# Altium footprint library Pcb-hionyPcbLib.PcbLib: 580 footprints (part 8 of 37)
Each footprint in its own frame and in the unit in brackets; x right, y up, seen from the top. Pads: shape width x height; smd on the part's side, far side on the other; paste and mask are expansions set on the pad; w line width, h text height; cw(c..) or ccw(c..) is an arc to the next point about the centre after c.
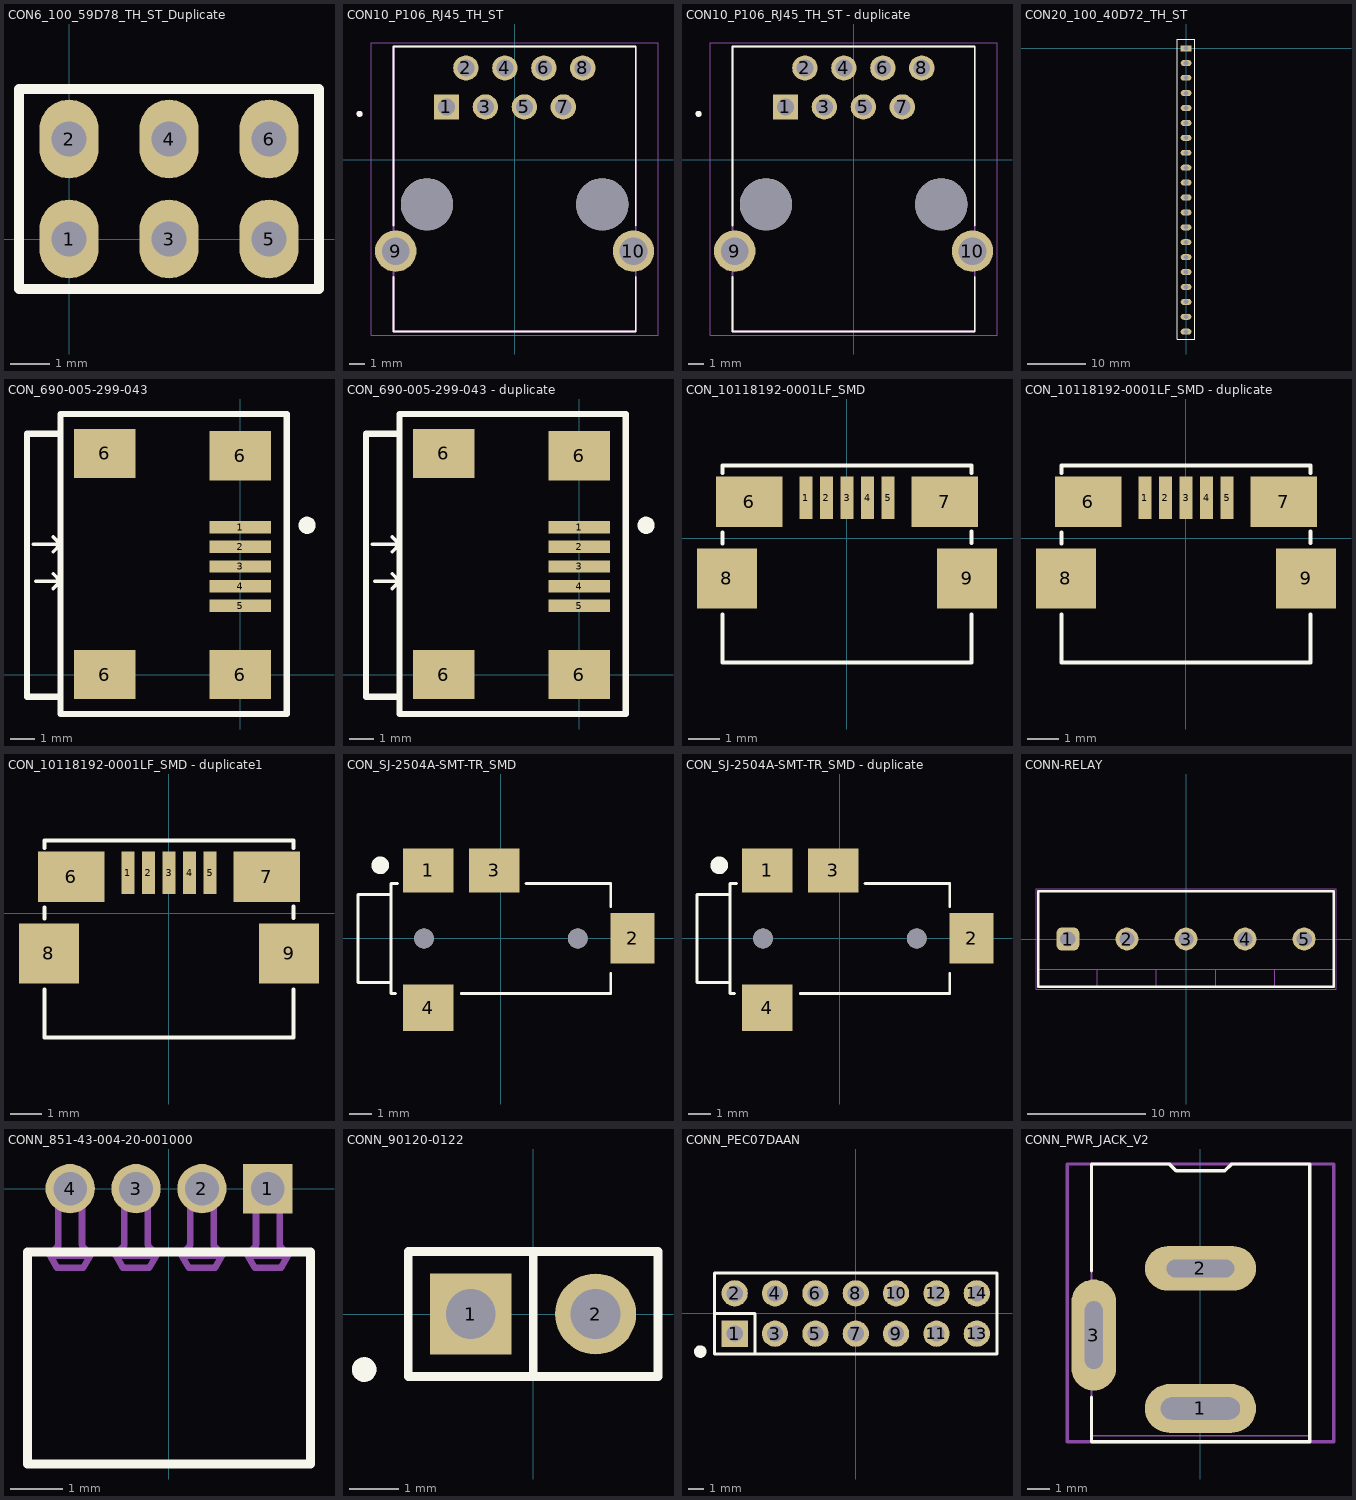
[diagram p7: the footprints below, top view; thin cyan lines are the x and y axes]

## CON6_100_59D78_TH_ST_Duplicate [mm] "Berg strip"
height 10
pads (6):
  oval 1.5x2 hole 0.9: 1(0,0) 2(0,2.54) 3(2.54,0) 4(2.54,2.54) 5(5.08,0) 6(5.08,2.54)
Top Overlay:
  lines w0.254: -1.27,-1.27 6.35,-1.27 6.35,3.81 -1.27,3.81 -1.27,-1.27
3D body "77313-118-06lf.stp": height 8.18, standoff -3.32, extent -1.07,-1.27 6.15,3.56

## CON10_P106_RJ45_TH_ST [mm]
pads (12):
  rect 1.65x1.65 hole 1.1: 1(-4.445,3.43)
  round 1.65 hole 1.1: 2(-3.175,5.97) 3(-1.905,3.43) 4(-0.635,5.97) 5(0.635,3.43) 6(1.905,5.97) 7(3.175,3.43) 8(4.445,5.97)
  round 2.7 hole 1.8: 9(-7.75,-5.97) 10(7.75,-5.97)
  round 3.4 hole 3.4 unplated: ""(-5.715,-2.92) ""(5.715,-2.92)
Top Overlay:
  circle w0.2: c-10.11,2.98 r0.1
  lines w0.127: -7.9,-7.64 -7.9,-11.22 7.9,-11.22 7.9,-7.64 ; -7.9,-4.3 -7.9,7.38 7.9,7.38 7.9,-4.3
Mechanical 13:
  circle w0.2: c-10.11,2.98 r0.1
  lines w0.127: -7.9,-11.22 7.9,-11.22 7.9,7.38 -7.9,7.38 -7.9,-11.22
Mechanical 15:
  lines w0.05: -9.35,-11.47 -9.35,7.63 9.35,7.63 9.35,-11.47 -9.35,-11.47
3D body "A-2004-2-4-LPS-N-R--3DModel-STEP-56544.STEP": height 13.01, standoff -3.79, extent -7.926,-11.205 7.874,7.395

## CON10_P106_RJ45_TH_ST - duplicate [mm]
pads (12):
  rect 1.65x1.65 hole 1.1: 1(-4.445,3.43)
  round 1.65 hole 1.1: 2(-3.175,5.97) 3(-1.905,3.43) 4(-0.635,5.97) 5(0.635,3.43) 6(1.905,5.97) 7(3.175,3.43) 8(4.445,5.97)
  round 2.7 hole 1.8: 9(-7.75,-5.97) 10(7.75,-5.97)
  round 3.4 hole 3.4 unplated: ""(-5.715,-2.92) ""(5.715,-2.92)
Top Overlay:
  circle w0.2: c-10.11,2.98 r0.1
  lines w0.127: -7.9,-7.64 -7.9,-11.22 7.9,-11.22 7.9,-7.64 ; -7.9,-4.3 -7.9,7.38 7.9,7.38 7.9,-4.3
Mechanical 13:
  circle w0.2: c-10.11,2.98 r0.1
  lines w0.127: -7.9,-11.22 7.9,-11.22 7.9,7.38 -7.9,7.38 -7.9,-11.22
Mechanical 15:
  lines w0.05: -9.35,-11.47 -9.35,7.63 9.35,7.63 9.35,-11.47 -9.35,-11.47
3D body "A-2004-2-4-LPS-N-R--3DModel-STEP-56544.STEP": height 13.01, standoff -3.79, extent -7.926,-11.205 7.874,7.395

## CON20_100_40D72_TH_ST [mil] "Berg strip"
height 393.7
pads (20):
  rect 72x40 hole 31.5: 1(0,0)
  oval 72x40 hole 31.5: 2(0,-98.43) 3(0,-196.85) 4(0,-300) 5(0,-400) 6(0,-500) 7(0,-600) 8(0,-700) 9(0,-800) 10(0,-900) 11(0,-1000) 12(0,-1100) 13(0,-1200) 14(0,-1300) 15(0,-1400) 16(0,-1500) 17(0,-1600) 18(0,-1700) 19(0,-1800) 20(0,-1900)
Top Overlay:
  lines w7.87: -58,-1949 57,-1949 57,62.99 -58,62.99 -58,-1949
3D body "pin_header_aw_109_20-t.stp": height 322.83, standoff -118.11, extent -51.14,-1949 47.14,51

## CON_690-005-299-043 [mm]
pads (9):
  rect 2.5x0.5 smd: 1(0,6) 2(0,5.2) 3(0,4.4) 4(0,3.6) 5(0,2.8)
  rect 2.5x2 smd: 6(-5.5,0) 6(-5.5,9) 6(0,0) 6(0,8.9)
Top Overlay:
  circle w0.381: c2.725,6.075 r0.158
  lines w0.152: -8.4,5.3 -7.4,5.3 ; -8.3,3.8 -7.4,3.8 ; -7.6,3.5 -7.3,3.8 -7.6,4.1 ; -7.6,5 -7.3,5.3 -7.6,5.6
  lines w0.254: -8.4,9.8 -7.3,9.8 ; -7.3,-0.9 -8.661,-0.9 -8.661,9.8 -7.3,9.8 ; -7.3,5 -7.3,4.9 ; -7.3,9.7 -7.3,10.6 1.9,10.6 1.9,-1.6 -7.3,-1.6 -7.3,9.8 ; -7.3,4.9 -7.3,4.9
3D body "5889.stp": height 3.96, standoff 0.01, extent -8.4,-0.55 0.6,9.35

## CON_690-005-299-043 - duplicate [mm]
pads (9):
  rect 2.5x0.5 smd: 1(0,6) 2(0,5.2) 3(0,4.4) 4(0,3.6) 5(0,2.8)
  rect 2.5x2 smd: 6(-5.5,0) 6(-5.5,9) 6(0,0) 6(0,8.9)
Top Overlay:
  circle w0.381: c2.725,6.075 r0.158
  lines w0.152: -8.4,5.3 -7.4,5.3 ; -8.3,3.8 -7.4,3.8 ; -7.6,3.5 -7.3,3.8 -7.6,4.1 ; -7.6,5 -7.3,5.3 -7.6,5.6
  lines w0.254: -8.4,9.8 -7.3,9.8 ; -7.3,-0.9 -8.661,-0.9 -8.661,9.8 -7.3,9.8 ; -7.3,5 -7.3,4.9 ; -7.3,9.7 -7.3,10.6 1.9,10.6 1.9,-1.6 -7.3,-1.6 -7.3,9.8 ; -7.3,4.9 -7.3,4.9
3D body "5889.stp": height 3.96, standoff 0.01, extent -8.4,-0.55 0.6,9.35

## CON_10118192-0001LF_SMD [mm]
pads (9):
  rect 0.4x1.35 smd: 1(-1.3,1.275) 2(-0.65,1.275) 3(0,1.275) 4(0.65,1.275) 5(1.3,1.275)
  rect 2.1x1.6 smd: 6(-3.1,1.15) 7(3.1,1.15)
  rect 1.9x1.9 smd: 8(-3.8,-1.275) 9(3.8,-1.275)
Top Overlay:
  lines w0.127: -3.95,-2.421 -3.95,-3.945 3.95,-3.945 3.95,-2.421 ; -3.95,-0.178 -3.95,0.178 ; -3.95,2.057 -3.95,2.3 3.95,2.3 3.95,2.057 ; 3.95,-0.152 3.95,0.203
3D body "zx62-b-5pa_33_.stp": height 2.81, standoff -0.14, extent -4.037,-3.945 4.037,1.655

## CON_10118192-0001LF_SMD - duplicate [mm]
pads (9):
  rect 0.4x1.35 smd: 1(-1.3,1.275) 2(-0.65,1.275) 3(0,1.275) 4(0.65,1.275) 5(1.3,1.275)
  rect 2.1x1.6 smd: 6(-3.1,1.15) 7(3.1,1.15)
  rect 1.9x1.9 smd: 8(-3.8,-1.275) 9(3.8,-1.275)
Top Overlay:
  lines w0.127: -3.95,-2.421 -3.95,-3.945 3.95,-3.945 3.95,-2.421 ; -3.95,-0.178 -3.95,0.178 ; -3.95,2.057 -3.95,2.3 3.95,2.3 3.95,2.057 ; 3.95,-0.152 3.95,0.203
3D body "zx62-b-5pa_33_.stp": height 2.81, standoff -0.14, extent -4.037,-3.945 4.037,1.655

## CON_10118192-0001LF_SMD - duplicate1 [mm] "USB2.0 MICRO"
height 1.85
pads (9):
  rect 0.4x1.35 smd: 1(-1.3,1.275) 2(-0.65,1.275) 3(0,1.275) 4(0.65,1.275) 5(1.3,1.275)
  rect 2.1x1.6 smd: 6(-3.1,1.15) 7(3.1,1.15)
  rect 1.9x1.9 smd: 8(-3.8,-1.275) 9(3.8,-1.275)
Top Overlay:
  lines w0.127: -3.95,-2.421 -3.95,-3.945 3.95,-3.945 3.95,-2.421 ; -3.95,-0.178 -3.95,0.178 ; -3.95,2.057 -3.95,2.3 3.95,2.3 3.95,2.057 ; 3.95,-0.152 3.95,0.203
3D body "zx62-b-5pa_33_.stp": height 2.81, standoff -0.14, extent -4.037,-3.945 4.037,1.655

## CON_SJ-2504A-SMT-TR_SMD [mm]
pads (6):
  rect 2.3x2 smd: 1(-3.3,3.1) 3(-0.3,3.1)
  rect 2x2.3 smd: 2(6,0)
  rect 2.3x2.1 smd: 4(-3.3,-3.15)
  round 0.9 hole 0.9 unplated: ""(-3.5,0) ""(3.5,0)
Top Overlay:
  circle w0.4: c-5.486,3.327 r0.2
  lines w0.127: -4.8,-2.5 -5,-2.5 -5,-2 ; -4.7,2.5 -5,2.5 -5,2 ; -1.8,-2.5 5,-2.5 5,-1.6 ; 1.15,2.5 5,2.5 5,1.45 ; -5,-2 -5,2 ; -5,-2 -6.5,-2 -6.5,2 -5,2
3D body "User Library-JY2512.step": height 4.01, standoff -0.79, extent -6.5,-4 6.5,4

## CON_SJ-2504A-SMT-TR_SMD - duplicate [mm]
pads (6):
  rect 2.3x2 smd: 1(-3.3,3.1) 3(-0.3,3.1)
  rect 2x2.3 smd: 2(6,0)
  rect 2.3x2.1 smd: 4(-3.3,-3.15)
  round 0.9 hole 0.9 unplated: ""(-3.5,0) ""(3.5,0)
Top Overlay:
  circle w0.4: c-5.486,3.327 r0.2
  lines w0.127: -4.8,-2.5 -5,-2.5 -5,-2 ; -4.7,2.5 -5,2.5 -5,2 ; -1.8,-2.5 5,-2.5 5,-1.6 ; 1.15,2.5 5,2.5 5,1.45 ; -5,-2 -5,2 ; -5,-2 -6.5,-2 -6.5,2 -5,2
3D body "User Library-JY2512.step": height 4.01, standoff -0.79, extent -6.5,-4 6.5,4

## CONN-RELAY [mm] "Serie 2417 - 5.00 mm _ 5 pins"
height 10
pads (5):
  rrect50% 1.95x1.95 hole 1.3: 1(-10,0)
  round 1.95 hole 1.3: 2(-5,0) 3(0,0) 4(5,0) 5(10,0)
Top Overlay:
  lines w0.2: -12.5,-4.05 -12.5,4.05 12.5,4.05 12.5,-4.05 -12.5,-4.05
Top Component Outline:
  lines w0.1: -12.5,-2.55 12.5,-2.55 ; -7.5,-4.05 -7.5,-2.55 ; -2.5,-4.05 -2.5,-2.55 ; 2.5,-4.05 2.5,-2.55 ; 7.5,-4.05 7.5,-2.55 ; -12.5,-4.05 12.5,-4.05 12.5,4.05 -12.5,4.05 -12.5,-4.05
Top Courtyard:
  lines w0.05: -12.7,-4.25 -12.7,4.25 12.7,4.25 12.7,-4.25 -12.7,-4.25
Top 3D Body:
  lines w0.1: -12.5,-2.55 12.5,-2.55 ; -7.5,-4.05 -7.5,-2.55 ; -2.5,-4.05 -2.5,-2.55 ; 2.5,-4.05 2.5,-2.55 ; 7.5,-4.05 7.5,-2.55 ; -12.5,-4.05 -12.5,4.05 12.5,4.05 12.5,-4.05 -12.5,-4.05
Top Designator:
  text ".Designator" at -7.498,-0.5 h1.5
Top Component Center:
  lines w0.05: -0.5,0 0.5,0 ; 0,-0.5 0,0.5
3D body "691241710005.stp": height 10.1, standoff -3.4, extent -12.5,-4.05 12.5,4.05

## CONN_851-43-004-20-001000 [mm]
pads (4):
  rect 0.95x0.95 hole 0.65: 1(1.905,0)
  round 0.95 hole 0.65: 2(0.635,0) 3(-0.635,0) 4(-1.905,0)
Top Overlay:
  lines w0.178: -2.73,-5.308 -2.73,-1.219 2.731,-1.219 2.731,-5.308 -2.73,-5.308
Top 3D Body:
  lines w0.127: -2.303,-1.273 -2.156,-1.126 ccw(c-2.21,-1.072) -2.133,-1.072 -2.133,-0.355 -2.133,0 cw(c-1.905,0) -1.905,0.229 cw(c-1.905,0) -1.676,0 -1.676,-0.355 -1.676,-1.072 ccw(c-1.6,-1.072) -1.654,-1.126 -1.506,-1.273 ; -2.291,-1.295 -1.905,-1.295 -1.519,-1.295 ; -1.033,-1.273 -0.886,-1.126 ccw(c-0.94,-1.072) -0.863,-1.072 -0.863,-0.355 -0.863,0 cw(c-0.635,0) -0.635,0.229 cw(c-0.635,0) -0.406,0 -0.406,-0.355 -0.406,-1.072 ccw(c-0.33,-1.072) -0.384,-1.126 -0.236,-1.273 ; -1.021,-1.295 -0.635,-1.295 -0.249,-1.295 ; 0.237,-1.273 0.384,-1.126 ccw(c0.33,-1.072) 0.407,-1.072 0.407,-0.355 0.407,0 cw(c0.635,0) 0.635,0.229 cw(c0.635,0) 0.864,0 0.864,-0.355 0.864,-1.072 ccw(c0.94,-1.072) 0.886,-1.126 1.034,-1.273 ; 0.249,-1.295 0.635,-1.295 1.021,-1.295 ; 1.507,-1.273 1.654,-1.126 ccw(c1.6,-1.072) 1.677,-1.072 1.677,-0.355 1.677,0 cw(c1.905,0) 1.905,0.229 cw(c1.905,0) 2.134,0 2.134,-0.355 2.134,-1.072 ccw(c2.21,-1.072) 2.156,-1.126 2.304,-1.273 ; 1.519,-1.295 1.905,-1.295 2.291,-1.295 ; -2.73,-5.308 2.731,-5.308 2.731,-1.219 2.335,-1.219 2.159,-1.524 1.651,-1.524 1.475,-1.219 1.065,-1.219 0.889,-1.524 0.381,-1.524 0.205,-1.219 -0.205,-1.219 -0.381,-1.524 -0.889,-1.524 -1.065,-1.219 -1.475,-1.219 -1.651,-1.524 -2.159,-1.524 -2.335,-1.219 -2.73,-1.219 -2.73,-5.308
  text ".Designator" at -1.27,-2.54 h0.64
3D body "mill-max-P851-43-004-20-001000.stp": height 2.23, standoff -2.79, extent -2.73,-5.308 2.731,0.229

## CONN_90120-0122 [mm]
pads (2):
  rect 1.65x1.65 hole 1.016 mask+0: 1(-1.27,0)
  round 1.65 hole 1.016 mask+0: 2(1.27,0)
Top Overlay:
  circle w0.25: c-3.44,-1.13 r0.125
  lines w0.178: 0,-1.27 0,1.27 ; -2.54,-1.27 2.54,-1.27 2.54,1.27 -2.54,1.27 -2.54,-1.27
Top 3D Body:
  circle w0.25: c-3.44,-1.13 r0.125
  lines w0.127: -2.54,-1.27 -2.54,1.27 2.54,1.27 2.54,-1.27 -2.54,-1.27
  text ".Designator" at -1.524,-0.508 h1.02
3D body "Molex_90120-0122.stp": height 9.29, standoff -3, extent -2.54,-1.27 2.54,1.27

## CONN_PEC07DAAN [mm]
pads (14):
  rect 1.65x1.65 hole 1.016 mask+0: 1(-7.62,-1.27)
  round 1.65 hole 1.016 mask+0: 2(-7.62,1.27) 3(-5.08,-1.27) 4(-5.08,1.27) 5(-2.54,-1.27) 6(-2.54,1.27) 7(0,-1.27) 8(0,1.27) 9(2.54,-1.27) 10(2.54,1.27) 11(5.08,-1.27) 12(5.08,1.27) 13(7.62,-1.27) 14(7.62,1.27)
Top Overlay:
  circle w0.381: c-9.79,-2.4 r0.203
  lines w0.178: -8.89,0 -6.35,0 -6.35,-2.54 ; -8.89,-2.54 -8.89,2.54 8.89,2.54 8.89,-2.54 -8.89,-2.54
Top 3D Body:
  rectangle: -8.128,-1.778 -7.112,-0.762
  lines w0.076: -8.89,-2.54 -8.89,2.54 8.89,2.54 8.89,-2.54 -8.89,-2.54
  lines w0.127: -8.89,-2.54 8.89,-2.54 8.89,2.54 -8.89,2.54 -8.89,-2.54
  text ".Designator" at -1.778,-0.508 h1.02
3D body: height 11.43, standoff -3.05, extent 2.223,0.953 2.858,1.588
3D body: height 11.43, standoff -3.05, extent 4.763,-1.587 5.398,-0.952
3D body: height 11.43, standoff -3.05, extent 4.763,0.953 5.398,1.588
3D body: height 11.43, standoff -3.05, extent 7.303,0.953 7.938,1.588
3D body: height 11.43, standoff -3.05, extent 7.303,-1.587 7.938,-0.952
3D body: height 11.43, standoff -3.05, extent 2.223,-1.587 2.858,-0.952
3D body: height 11.43, standoff -3.05, extent -0.317,0.953 0.318,1.588
3D body: height 11.43, standoff -3.05, extent -0.317,-1.587 0.318,-0.952
3D body: height 11.43, standoff -3.05, extent -2.857,0.953 -2.222,1.588
3D body: height 11.43, standoff -3.05, extent -2.857,-1.587 -2.222,-0.952
3D body: height 11.43, standoff -3.05, extent -5.397,-1.587 -4.762,-0.952
3D body: height 11.43, standoff -3.05, extent -5.397,0.953 -4.762,1.588
3D body: height 11.43, standoff -3.05, extent -7.937,0.953 -7.302,1.588
3D body: height 11.43, standoff -3.05, extent -7.937,-1.587 -7.302,-0.952
3D body: height 2.54, standoff 0, extent -8.954,-2.603 8.954,2.603

## CONN_PWR_JACK_V2 [mm]
pads (3):
  oval 5x2.2 hole 1 slot 3.56 at 0 deg: 1(0,-14)
  oval 5x2 hole 0.8 slot 3.05 at 0 deg: 2(0,-7.7)
  oval 2x5 hole 0.8 slot 3.05 at 90 deg: 3(-4.8,-10.7)
Top Overlay:
  lines w0.15: -4.9,-13.5 -4.9,-15.5 4.925,-15.5 4.925,-3 1.4,-3 1.1,-3.3 -1.1,-3.3 -1.4,-3 -4.9,-3 -4.9,-7.8
Mechanical 13:
  lines w0.076: -4.9,-12.4 -4.9,-15.225 4.925,-15.225 4.925,-3 1.4,-3 1.1,-3.3 -1.1,-3.3 -1.4,-3 -4.9,-3 -4.9,-9
Mechanical 15:
  lines w0.15: -6,-15.5 -6,-3 6,-3 6,-15.5 -6,-15.5
  text ".Designator" at -0.175,-9.625 h0.55
3D body "3100-522 Connector.stp": height 11, standoff -3.5, extent -4.9,-14.1 4.5,0